# Altium schematic symbol library WR-TBL_Pluggable PCB Header.SchLib: 719 symbols (part 4 of 5) (continued)
## 691382010012
designator P?
WR-TBL Serie 382 Horizontal PCB Header, Pluggable, pitch 2.5mm, 12p; Part Number: 691382010012; Compliance: RoHS; Modularity: No; Pin Number: 12; Rated Current [UL]: 12A; Working Voltage [UL]: 300VAC; ComponentLink1Description: Manufacturer; ComponentLink1URL: http://www.we-online.de; ComponentLink2URL: https://katalog.we-online.de/em/datasheet/691382010012.pdf; ComponentLink2Description: Datasheet; Mounting Technology: THT; Packaging: Box; Operating Temperature: -40 to +105degC; PCB/Cable/Panel: PCB; Pitch: 2.5mm; Published Date: October 2019; Type: Horizontal; Publisher: Wurth Elektronik; Application: Pluggable
footprint 691382010012
pins: 1, 2, 3, 4, 5, 6, 7, 8, 9, 10, 11, 12

## 691382030002
designator P?
WR-TBL Serie 382 Vertical PCB Header with Flanges, Pluggable, pitch 2.5mm, 2p; Part Number: 691382030002; Compliance: RoHS; Modularity: No; Pin Number: 2; Rated Current [UL]: 12A; Working Voltage [UL]: 300VAC; ComponentLink1Description: Manufacturer; ComponentLink1URL: http://www.we-online.de; ComponentLink2URL: https://katalog.we-online.de/em/datasheet/691382030002.pdf; ComponentLink2Description: Datasheet; Mounting Technology: THT; Packaging: Box; Operating Temperature: -40 to +105degC; PCB/Cable/Panel: PCB; Pitch: 2.5mm; Published Date: October 2019; Type: Vertical; Publisher: Wurth Elektronik; Application: Pluggable
footprint 691382030002
pins: 1, 2

## 691382030003
designator P?
WR-TBL Serie 382 Vertical PCB Header with Flanges, Pluggable, pitch 2.5mm, 3p; Part Number: 691382030003; Compliance: RoHS; Modularity: No; Pin Number: 3; Rated Current [UL]: 12A; Working Voltage [UL]: 300VAC; ComponentLink1Description: Manufacturer; ComponentLink1URL: http://www.we-online.de; ComponentLink2URL: https://katalog.we-online.de/em/datasheet/691382030003.pdf; ComponentLink2Description: Datasheet; Mounting Technology: THT; Packaging: Box; Operating Temperature: -40 to +105degC; PCB/Cable/Panel: PCB; Pitch: 2.5mm; Published Date: October 2019; Type: Vertical; Publisher: Wurth Elektronik; Application: Pluggable
footprint 691382030003
pins: 1, 2, 3

## 691382030004
designator P?
WR-TBL Serie 382 Vertical PCB Header with Flanges, Pluggable, pitch 2.5mm, 4p; Part Number: 691382030004; Compliance: RoHS; Modularity: No; Pin Number: 4; Rated Current [UL]: 12A; Working Voltage [UL]: 300VAC; ComponentLink1Description: Manufacturer; ComponentLink1URL: http://www.we-online.de; ComponentLink2URL: https://katalog.we-online.de/em/datasheet/691382030004.pdf; ComponentLink2Description: Datasheet; Mounting Technology: THT; Packaging: Box; Operating Temperature: -40 to +105degC; PCB/Cable/Panel: PCB; Pitch: 2.5mm; Published Date: October 2019; Type: Vertical; Publisher: Wurth Elektronik; Application: Pluggable
footprint 691382030004
pins: 1, 2, 3, 4

## 691382030005
designator P?
WR-TBL Serie 382 Vertical PCB Header with Flanges, Pluggable, pitch 2.5mm, 5p; Part Number: 691382030005; Compliance: RoHS; Modularity: No; Pin Number: 5; Rated Current [UL]: 12A; Working Voltage [UL]: 300VAC; ComponentLink1Description: Manufacturer; ComponentLink1URL: http://www.we-online.de; ComponentLink2URL: https://katalog.we-online.de/em/datasheet/691382030005.pdf; ComponentLink2Description: Datasheet; Mounting Technology: THT; Packaging: Box; Operating Temperature: -40 to +105degC; PCB/Cable/Panel: PCB; Pitch: 2.5mm; Published Date: October 2019; Type: Vertical; Publisher: Wurth Elektronik; Application: Pluggable
footprint 691382030005
pins: 1, 2, 3, 4, 5

## 691382030006
designator P?
WR-TBL Serie 382 Vertical PCB Header with Flanges, Pluggable, pitch 2.5mm, 6p; Part Number: 691382030006; Compliance: RoHS; Modularity: No; Pin Number: 6; Rated Current [UL]: 12A; Working Voltage [UL]: 300VAC; ComponentLink1Description: Manufacturer; ComponentLink1URL: http://www.we-online.de; ComponentLink2URL: https://katalog.we-online.de/em/datasheet/691382030006.pdf; ComponentLink2Description: Datasheet; Mounting Technology: THT; Packaging: Box; Operating Temperature: -40 to +105degC; PCB/Cable/Panel: PCB; Pitch: 2.5mm; Published Date: October 2019; Type: Vertical; Publisher: Wurth Elektronik; Application: Pluggable
footprint 691382030006
pins: 1, 2, 3, 4, 5, 6

## 691382030007
designator P?
WR-TBL Serie 382 Vertical PCB Header with Flanges, Pluggable, pitch 2.5mm, 7p; Part Number: 691382030007; Compliance: RoHS; Modularity: No; Pin Number: 7; Rated Current [UL]: 12A; Working Voltage [UL]: 300VAC; ComponentLink1Description: Manufacturer; ComponentLink1URL: http://www.we-online.de; ComponentLink2URL: https://katalog.we-online.de/em/datasheet/691382030007.pdf; ComponentLink2Description: Datasheet; Mounting Technology: THT; Packaging: Box; Operating Temperature: -40 to +105degC; PCB/Cable/Panel: PCB; Pitch: 2.5mm; Published Date: October 2019; Type: Vertical; Publisher: Wurth Elektronik; Application: Pluggable
footprint 691382030007
pins: 1, 2, 3, 4, 5, 6, 7

## 691382030008
designator P?
WR-TBL Serie 382 Vertical PCB Header with Flanges, Pluggable, pitch 2.5mm, 8p; Part Number: 691382030008; Compliance: RoHS; Modularity: No; Pin Number: 8; Rated Current [UL]: 12A; Working Voltage [UL]: 300VAC; ComponentLink1Description: Manufacturer; ComponentLink1URL: http://www.we-online.de; ComponentLink2URL: https://katalog.we-online.de/em/datasheet/691382030008.pdf; ComponentLink2Description: Datasheet; Mounting Technology: THT; Packaging: Box; Operating Temperature: -40 to +105degC; PCB/Cable/Panel: PCB; Pitch: 2.5mm; Published Date: October 2019; Type: Vertical; Publisher: Wurth Elektronik; Application: Pluggable
footprint 691382030008
pins: 1, 2, 3, 4, 5, 6, 7, 8

## 691382030012
designator P?
WR-TBL Serie 382 Vertical PCB Header with Flanges, Pluggable, pitch 2.5mm, 12p; Part Number: 691382030012; Compliance: RoHS; Modularity: No; Pin Number: 12; Rated Current [UL]: 12A; Working Voltage [UL]: 300VAC; ComponentLink1Description: Manufacturer; ComponentLink1URL: http://www.we-online.de; ComponentLink2URL: https://katalog.we-online.de/em/datasheet/691382030012.pdf; ComponentLink2Description: Datasheet; Mounting Technology: THT; Packaging: Box; Operating Temperature: -40 to +105degC; PCB/Cable/Panel: PCB; Pitch: 2.5mm; Published Date: October 2019; Type: Vertical; Publisher: Wurth Elektronik; Application: Pluggable
footprint 691382030012
pins: 1, 2, 3, 4, 5, 6, 7, 8, 9, 10, 11, 12

## 691382040002
designator P?
WR-TBL Serie 382 Horizontal PCB Header with Flanges, Pluggable, pitch 2.5mm, 2p; Part Number: 691382040002; Compliance: RoHS; Modularity: No; Pin Number: 2; Rated Current [UL]: 12A; Working Voltage [UL]: 300VAC; ComponentLink1Description: Manufacturer; ComponentLink1URL: http://www.we-online.de; ComponentLink2URL: https://katalog.we-online.de/em/datasheet/691382040002.pdf; ComponentLink2Description: Datasheet; Mounting Technology: THT; Packaging: Box; Operating Temperature: -40 to +105degC; PCB/Cable/Panel: PCB; Pitch: 2.5mm; Published Date: October 2019; Type: Horizontal; Publisher: Wurth Elektronik; Application: Pluggable
footprint 691382040002
pins: 1, 2

## 691382040003
designator P?
WR-TBL Serie 382 Horizontal PCB Header with Flanges, Pluggable, pitch 2.5mm, 3p; Part Number: 691382040003; Compliance: RoHS; Modularity: No; Pin Number: 3; Rated Current [UL]: 12A; Working Voltage [UL]: 300VAC; ComponentLink1Description: Manufacturer; ComponentLink1URL: http://www.we-online.de; ComponentLink2URL: https://katalog.we-online.de/em/datasheet/691382040003.pdf; ComponentLink2Description: Datasheet; Mounting Technology: THT; Packaging: Box; Operating Temperature: -40 to +105degC; PCB/Cable/Panel: PCB; Pitch: 2.5mm; Published Date: October 2019; Type: Horizontal; Publisher: Wurth Elektronik; Application: Pluggable
footprint 691382040003
pins: 1, 2, 3

## 691382040004
designator P?
WR-TBL Serie 382 Horizontal PCB Header with Flanges, Pluggable, pitch 2.5mm, 4p; Part Number: 691382040004; Compliance: RoHS; Modularity: No; Pin Number: 4; Rated Current [UL]: 12A; Working Voltage [UL]: 300VAC; ComponentLink1Description: Manufacturer; ComponentLink1URL: http://www.we-online.de; ComponentLink2URL: https://katalog.we-online.de/em/datasheet/691382040004.pdf; ComponentLink2Description: Datasheet; Mounting Technology: THT; Packaging: Box; Operating Temperature: -40 to +105degC; PCB/Cable/Panel: PCB; Pitch: 2.5mm; Published Date: October 2019; Type: Horizontal; Publisher: Wurth Elektronik; Application: Pluggable
footprint 691382040004
pins: 1, 2, 3, 4

## 691382040005
designator P?
WR-TBL Serie 382 Horizontal PCB Header with Flanges, Pluggable, pitch 2.5mm, 5p; Part Number: 691382040005; Compliance: RoHS; Modularity: No; Pin Number: 5; Rated Current [UL]: 12A; Working Voltage [UL]: 300VAC; ComponentLink1Description: Manufacturer; ComponentLink1URL: http://www.we-online.de; ComponentLink2URL: https://katalog.we-online.de/em/datasheet/691382040005.pdf; ComponentLink2Description: Datasheet; Mounting Technology: THT; Packaging: Box; Operating Temperature: -40 to +105degC; PCB/Cable/Panel: PCB; Pitch: 2.5mm; Published Date: October 2019; Type: Horizontal; Publisher: Wurth Elektronik; Application: Pluggable
footprint 691382040005
pins: 1, 2, 3, 4, 5

## 691382040006
designator P?
WR-TBL Serie 382 Horizontal PCB Header with Flanges, Pluggable, pitch 2.5mm, 6p; Part Number: 691382040006; Compliance: RoHS; Modularity: No; Pin Number: 6; Rated Current [UL]: 12A; Working Voltage [UL]: 300VAC; ComponentLink1Description: Manufacturer; ComponentLink1URL: http://www.we-online.de; ComponentLink2URL: https://katalog.we-online.de/em/datasheet/691382040006.pdf; ComponentLink2Description: Datasheet; Mounting Technology: THT; Packaging: Box; Operating Temperature: -40 to +105degC; PCB/Cable/Panel: PCB; Pitch: 2.5mm; Published Date: October 2019; Type: Horizontal; Publisher: Wurth Elektronik; Application: Pluggable
footprint 691382040006
pins: 1, 2, 3, 4, 5, 6

## 691382040007
designator P?
WR-TBL Serie 382 Horizontal PCB Header with Flanges, Pluggable, pitch 2.5mm, 7p; Part Number: 691382040007; Compliance: RoHS; Modularity: No; Pin Number: 7; Rated Current [UL]: 12A; Working Voltage [UL]: 300VAC; ComponentLink1Description: Manufacturer; ComponentLink1URL: http://www.we-online.de; ComponentLink2URL: https://katalog.we-online.de/em/datasheet/691382040007.pdf; ComponentLink2Description: Datasheet; Mounting Technology: THT; Packaging: Box; Operating Temperature: -40 to +105degC; PCB/Cable/Panel: PCB; Pitch: 2.5mm; Published Date: October 2019; Type: Horizontal; Publisher: Wurth Elektronik; Application: Pluggable
footprint 691382040007
pins: 1, 2, 3, 4, 5, 6, 7

## 691382040008
designator P?
WR-TBL Serie 382 Horizontal PCB Header with Flanges, Pluggable, pitch 2.5mm, 8p; Part Number: 691382040008; Compliance: RoHS; Modularity: No; Pin Number: 8; Rated Current [UL]: 12A; Working Voltage [UL]: 300VAC; ComponentLink1Description: Manufacturer; ComponentLink1URL: http://www.we-online.de; ComponentLink2URL: https://katalog.we-online.de/em/datasheet/691382040008.pdf; ComponentLink2Description: Datasheet; Mounting Technology: THT; Packaging: Box; Operating Temperature: -40 to +105degC; PCB/Cable/Panel: PCB; Pitch: 2.5mm; Published Date: October 2019; Type: Horizontal; Publisher: Wurth Elektronik; Application: Pluggable
footprint 691382040008
pins: 1, 2, 3, 4, 5, 6, 7, 8

## 691382040012
designator P?
WR-TBL Serie 382 Horizontal PCB Header with Flanges, Pluggable, pitch 2.5mm, 12p; Part Number: 691382040012; Compliance: RoHS; Modularity: No; Pin Number: 12; Rated Current [UL]: 12A; Working Voltage [UL]: 300VAC; ComponentLink1Description: Manufacturer; ComponentLink1URL: http://www.we-online.de; ComponentLink2URL: https://katalog.we-online.de/em/datasheet/691382040012.pdf; ComponentLink2Description: Datasheet; Mounting Technology: THT; Packaging: Box; Operating Temperature: -40 to +105degC; PCB/Cable/Panel: PCB; Pitch: 2.5mm; Published Date: October 2019; Type: Horizontal; Publisher: Wurth Elektronik; Application: Pluggable
footprint 691382040012
pins: 1, 2, 3, 4, 5, 6, 7, 8, 9, 10, 11, 12

## 691386700002
designator P?
WR-TBL Serie 386 Horizontal/Vertical Divisible PCB Header, Pluggable, pitch 5mm, 2p; Part Number: 691386700002; Compliance: RoHS; Modularity: No; Pin Number: 2; Rated Current [UL]: 14A; Working Voltage [UL]: 300VAC; ComponentLink1Description: Manufacturer; ComponentLink1URL: http://www.we-online.de; ComponentLink2URL: https://katalog.we-online.de/em/datasheet/691386700002.pdf; ComponentLink2Description: Datasheet; Mounting Technology: THT; Packaging: Box; Operating Temperature: -30 to +120degC; PCB/Cable/Panel: PCB; Pitch: 5mm; Published Date: October 2019; Type: Horizontal/Vertical; Publisher: Wurth Elektronik; Application: Pluggable
footprint 691386700002
pins: 1, 2

## 691386700003
designator P?
WR-TBL Serie 386 Horizontal/Vertical Divisible PCB Header, Pluggable, pitch 5mm, 3p; Part Number: 691386700003; Compliance: RoHS; Modularity: No; Pin Number: 3; Rated Current [UL]: 14A; Working Voltage [UL]: 300VAC; ComponentLink1Description: Manufacturer; ComponentLink1URL: http://www.we-online.de; ComponentLink2URL: https://katalog.we-online.de/em/datasheet/691386700003.pdf; ComponentLink2Description: Datasheet; Mounting Technology: THT; Packaging: Box; Operating Temperature: -30 to +120degC; PCB/Cable/Panel: PCB; Pitch: 5mm; Published Date: October 2019; Type: Horizontal/Vertical; Publisher: Wurth Elektronik; Application: Pluggable
footprint 691386700003
pins: 1, 2, 3

## 691386700004
designator P?
WR-TBL Serie 386 Horizontal/Vertical Divisible PCB Header, Pluggable, pitch 5mm, 4p; Part Number: 691386700004; Compliance: RoHS; Modularity: No; Pin Number: 4; Rated Current [UL]: 14A; Working Voltage [UL]: 300VAC; ComponentLink1Description: Manufacturer; ComponentLink1URL: http://www.we-online.de; ComponentLink2URL: https://katalog.we-online.de/em/datasheet/691386700004.pdf; ComponentLink2Description: Datasheet; Mounting Technology: THT; Packaging: Box; Operating Temperature: -30 to +120degC; PCB/Cable/Panel: PCB; Pitch: 5mm; Published Date: October 2019; Type: Horizontal/Vertical; Publisher: Wurth Elektronik; Application: Pluggable
footprint 691386700004
pins: 1, 2, 3, 4

## 691386700005
designator P?
WR-TBL Serie 386 Horizontal/Vertical Divisible PCB Header, Pluggable, pitch 5mm, 5p; Part Number: 691386700005; Compliance: RoHS; Modularity: No; Pin Number: 5; Rated Current [UL]: 14A; Working Voltage [UL]: 300VAC; ComponentLink1Description: Manufacturer; ComponentLink1URL: http://www.we-online.de; ComponentLink2URL: https://katalog.we-online.de/em/datasheet/691386700005.pdf; ComponentLink2Description: Datasheet; Mounting Technology: THT; Packaging: Box; Operating Temperature: -30 to +120degC; PCB/Cable/Panel: PCB; Pitch: 5mm; Published Date: October 2019; Type: Horizontal/Vertical; Publisher: Wurth Elektronik; Application: Pluggable
footprint 691386700005
pins: 1, 2, 3, 4, 5

## 691386700006
designator P?
WR-TBL Serie 386 Horizontal/Vertical Divisible PCB Header, Pluggable, pitch 5mm, 6p; Part Number: 691386700006; Compliance: RoHS; Modularity: No; Pin Number: 6; Rated Current [UL]: 14A; Working Voltage [UL]: 300VAC; ComponentLink1Description: Manufacturer; ComponentLink1URL: http://www.we-online.de; ComponentLink2URL: https://katalog.we-online.de/em/datasheet/691386700006.pdf; ComponentLink2Description: Datasheet; Mounting Technology: THT; Packaging: Box; Operating Temperature: -30 to +120degC; PCB/Cable/Panel: PCB; Pitch: 5mm; Published Date: October 2019; Type: Horizontal/Vertical; Publisher: Wurth Elektronik; Application: Pluggable
footprint 691386700006
pins: 1, 2, 3, 4, 5, 6

## 691386700007
designator P?
WR-TBL Serie 386 Horizontal/Vertical Divisible PCB Header, Pluggable, pitch 5mm, 7p; Part Number: 691386700007; Compliance: RoHS; Modularity: No; Pin Number: 7; Rated Current [UL]: 14A; Working Voltage [UL]: 300VAC; ComponentLink1Description: Manufacturer; ComponentLink1URL: http://www.we-online.de; ComponentLink2URL: https://katalog.we-online.de/em/datasheet/691386700007.pdf; ComponentLink2Description: Datasheet; Mounting Technology: THT; Packaging: Box; Operating Temperature: -30 to +120degC; PCB/Cable/Panel: PCB; Pitch: 5mm; Published Date: October 2019; Type: Horizontal/Vertical; Publisher: Wurth Elektronik; Application: Pluggable
footprint 691386700007
pins: 1, 2, 3, 4, 5, 6, 7

## 691386700008
designator P?
WR-TBL Serie 386 Horizontal/Vertical Divisible PCB Header, Pluggable, pitch 5mm, 8p; Part Number: 691386700008; Compliance: RoHS; Modularity: No; Pin Number: 8; Rated Current [UL]: 14A; Working Voltage [UL]: 300VAC; ComponentLink1Description: Manufacturer; ComponentLink1URL: http://www.we-online.de; ComponentLink2URL: https://katalog.we-online.de/em/datasheet/691386700008.pdf; ComponentLink2Description: Datasheet; Mounting Technology: THT; Packaging: Box; Operating Temperature: -30 to +120degC; PCB/Cable/Panel: PCB; Pitch: 5mm; Published Date: October 2019; Type: Horizontal/Vertical; Publisher: Wurth Elektronik; Application: Pluggable
footprint 691386700008
pins: 1, 2, 3, 4, 5, 6, 7, 8

## 691386700009
designator P?
WR-TBL Serie 386 Horizontal/Vertical Divisible PCB Header, Pluggable, pitch 5mm, 9p; Part Number: 691386700009; Compliance: RoHS; Modularity: No; Pin Number: 9; Rated Current [UL]: 14A; Working Voltage [UL]: 300VAC; ComponentLink1Description: Manufacturer; ComponentLink1URL: http://www.we-online.de; ComponentLink2URL: https://katalog.we-online.de/em/datasheet/691386700009.pdf; ComponentLink2Description: Datasheet; Mounting Technology: THT; Packaging: Box; Operating Temperature: -30 to +120degC; PCB/Cable/Panel: PCB; Pitch: 5mm; Published Date: October 2019; Type: Horizontal/Vertical; Publisher: Wurth Elektronik; Application: Pluggable
footprint 691386700009
pins: 1, 2, 3, 4, 5, 6, 7, 8, 9

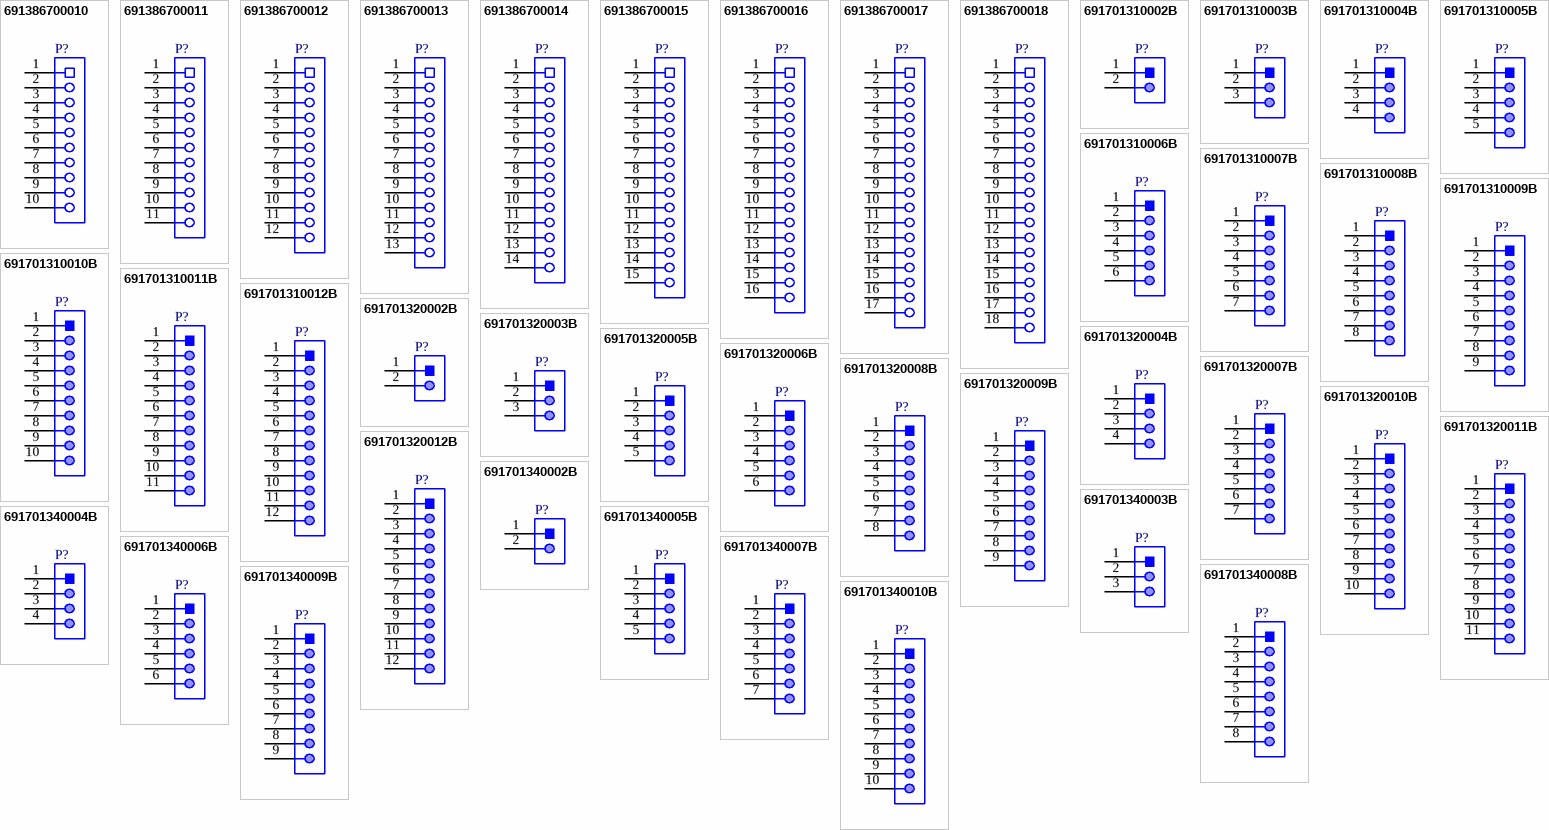
[diagram p15: symbols 691386700010 to 691701340010B]

## 691386700010
designator P?
WR-TBL Serie 386 Horizontal/Vertical Divisible PCB Header, Pluggable, pitch 5mm, 10p; Part Number: 691386700010; Compliance: RoHS; Modularity: No; Pin Number: 10; Rated Current [UL]: 14A; Working Voltage [UL]: 300VAC; ComponentLink1Description: Manufacturer; ComponentLink1URL: http://www.we-online.de; ComponentLink2URL: https://katalog.we-online.de/em/datasheet/691386700010.pdf; ComponentLink2Description: Datasheet; Mounting Technology: THT; Packaging: Box; Operating Temperature: -30 to +120degC; PCB/Cable/Panel: PCB; Pitch: 5mm; Published Date: October 2019; Type: Horizontal/Vertical; Publisher: Wurth Elektronik; Application: Pluggable
footprint 691386700010
pins: 1, 2, 3, 4, 5, 6, 7, 8, 9, 10

## 691386700011
designator P?
WR-TBL Serie 386 Horizontal/Vertical Divisible PCB Header, Pluggable, pitch 5mm, 11p; Part Number: 691386700011; Compliance: RoHS; Modularity: No; Pin Number: 11; Rated Current [UL]: 14A; Working Voltage [UL]: 300VAC; ComponentLink1Description: Manufacturer; ComponentLink1URL: http://www.we-online.de; ComponentLink2URL: https://katalog.we-online.de/em/datasheet/691386700011.pdf; ComponentLink2Description: Datasheet; Mounting Technology: THT; Packaging: Box; Operating Temperature: -30 to +120degC; PCB/Cable/Panel: PCB; Pitch: 5mm; Published Date: October 2019; Type: Horizontal/Vertical; Publisher: Wurth Elektronik; Application: Pluggable
footprint 691386700011
pins: 1, 2, 3, 4, 5, 6, 7, 8, 9, 10, 11

## 691386700012
designator P?
WR-TBL Serie 386 Horizontal/Vertical Divisible PCB Header, Pluggable, pitch 5mm, 12p; Part Number: 691386700012; Compliance: RoHS; Modularity: No; Pin Number: 12; Rated Current [UL]: 14A; Working Voltage [UL]: 300VAC; ComponentLink1Description: Manufacturer; ComponentLink1URL: http://www.we-online.de; ComponentLink2URL: https://katalog.we-online.de/em/datasheet/691386700012.pdf; ComponentLink2Description: Datasheet; Mounting Technology: THT; Packaging: Box; Operating Temperature: -30 to +120degC; PCB/Cable/Panel: PCB; Pitch: 5mm; Published Date: October 2019; Type: Horizontal/Vertical; Publisher: Wurth Elektronik; Application: Pluggable
footprint 691386700012
pins: 1, 2, 3, 4, 5, 6, 7, 8, 9, 10, 11, 12

## 691386700013
designator P?
WR-TBL Serie 386 Horizontal/Vertical Divisible PCB Header, Pluggable, pitch 5mm, 13p; Part Number: 691386700013; Compliance: RoHS; Modularity: No; Pin Number: 13; Rated Current [UL]: 14A; Working Voltage [UL]: 300VAC; ComponentLink1Description: Manufacturer; ComponentLink1URL: http://www.we-online.de; ComponentLink2URL: https://katalog.we-online.de/em/datasheet/691386700013.pdf; ComponentLink2Description: Datasheet; Mounting Technology: THT; Packaging: Box; Operating Temperature: -30 to +120degC; PCB/Cable/Panel: PCB; Pitch: 5mm; Published Date: October 2019; Type: Horizontal/Vertical; Publisher: Wurth Elektronik; Application: Pluggable
footprint 691386700013
pins: 1, 2, 3, 4, 5, 6, 7, 8, 9, 10, 11, 12, 13

## 691386700014
designator P?
WR-TBL Serie 386 Horizontal/Vertical Divisible PCB Header, Pluggable, pitch 5mm, 14p; Part Number: 691386700014; Compliance: RoHS; Modularity: No; Pin Number: 14; Rated Current [UL]: 14A; Working Voltage [UL]: 300VAC; ComponentLink1Description: Manufacturer; ComponentLink1URL: http://www.we-online.de; ComponentLink2URL: https://katalog.we-online.de/em/datasheet/691386700014.pdf; ComponentLink2Description: Datasheet; Mounting Technology: THT; Packaging: Box; Operating Temperature: -30 to +120degC; PCB/Cable/Panel: PCB; Pitch: 5mm; Published Date: October 2019; Type: Horizontal/Vertical; Publisher: Wurth Elektronik; Application: Pluggable
footprint 691386700014
pins: 1, 2, 3, 4, 5, 6, 7, 8, 9, 10, 11, 12, 13, 14

## 691386700015
designator P?
WR-TBL Serie 386 Horizontal/Vertical Divisible PCB Header, Pluggable, pitch 5mm, 15p; Part Number: 691386700015; Compliance: RoHS; Modularity: No; Pin Number: 15; Rated Current [UL]: 14A; Working Voltage [UL]: 300VAC; ComponentLink1Description: Manufacturer; ComponentLink1URL: http://www.we-online.de; ComponentLink2URL: https://katalog.we-online.de/em/datasheet/691386700015.pdf; ComponentLink2Description: Datasheet; Mounting Technology: THT; Packaging: Box; Operating Temperature: -30 to +120degC; PCB/Cable/Panel: PCB; Pitch: 5mm; Published Date: October 2019; Type: Horizontal/Vertical; Publisher: Wurth Elektronik; Application: Pluggable
footprint 691386700015
pins: 1, 2, 3, 4, 5, 6, 7, 8, 9, 10, 11, 12, 13, 14, 15

## 691386700016
designator P?
WR-TBL Serie 386 Horizontal/Vertical Divisible PCB Header, Pluggable, pitch 5mm, 16p; Part Number: 691386700016; Compliance: RoHS; Modularity: No; Pin Number: 16; Rated Current [UL]: 14A; Working Voltage [UL]: 300VAC; ComponentLink1Description: Manufacturer; ComponentLink1URL: http://www.we-online.de; ComponentLink2URL: https://katalog.we-online.de/em/datasheet/691386700016.pdf; ComponentLink2Description: Datasheet; Mounting Technology: THT; Packaging: Box; Operating Temperature: -30 to +120degC; PCB/Cable/Panel: PCB; Pitch: 5mm; Published Date: October 2019; Type: Horizontal/Vertical; Publisher: Wurth Elektronik; Application: Pluggable
footprint 691386700016
pins: 1, 2, 3, 4, 5, 6, 7, 8, 9, 10, 11, 12, 13, 14, 15, 16

## 691386700017
designator P?
WR-TBL Serie 386 Horizontal/Vertical Divisible PCB Header, Pluggable, pitch 5mm, 17p; Part Number: 691386700017; Compliance: RoHS; Modularity: No; Pin Number: 17; Rated Current [UL]: 14A; Working Voltage [UL]: 300VAC; ComponentLink1Description: Manufacturer; ComponentLink1URL: http://www.we-online.de; ComponentLink2URL: https://katalog.we-online.de/em/datasheet/691386700017.pdf; ComponentLink2Description: Datasheet; Mounting Technology: THT; Packaging: Box; Operating Temperature: -30 to +120degC; PCB/Cable/Panel: PCB; Pitch: 5mm; Published Date: October 2019; Type: Horizontal/Vertical; Publisher: Wurth Elektronik; Application: Pluggable
footprint 691386700017
pins: 1, 2, 3, 4, 5, 6, 7, 8, 9, 10, 11, 12, 13, 14, 15, 16, 17

## 691386700018
designator P?
WR-TBL Serie 386 Horizontal/Vertical Divisible PCB Header, Pluggable, pitch 5mm, 18p; Part Number: 691386700018; Compliance: RoHS; Modularity: No; Pin Number: 18; Rated Current [UL]: 14A; Working Voltage [UL]: 300VAC; ComponentLink1Description: Manufacturer; ComponentLink1URL: http://www.we-online.de; ComponentLink2URL: https://katalog.we-online.de/em/datasheet/691386700018.pdf; ComponentLink2Description: Datasheet; Mounting Technology: THT; Packaging: Box; Operating Temperature: -30 to +120degC; PCB/Cable/Panel: PCB; Pitch: 5mm; Published Date: October 2019; Type: Horizontal/Vertical; Publisher: Wurth Elektronik; Application: Pluggable
footprint 691386700018
pins: 1, 2, 3, 4, 5, 6, 7, 8, 9, 10, 11, 12, 13, 14, 15, 16, 17, 18

## 691701310002B
designator P?
WR-TBL Serie 7013B Vertical PCB Header THR Type, Pluggable, pitch 3.81mm, 2p; Part Number: 691701310002B; Compliance: RoHS; Modularity: No; Pin Number: 2; Rated Current [UL]: 10A; Working Voltage [UL]: 300VAC; ComponentLink1Description: Manufacturer; ComponentLink1URL: http://www.we-online.de; ComponentLink2URL: https://katalog.we-online.de/em/datasheet/691701310002B.pdf; ComponentLink2Description: Datasheet; Mounting Technology: THR; Packaging: Box; Operating Temperature: -40 to +105degC; PCB/Cable/Panel: PCB; Pitch: 3.81mm; Published Date: October 2019; Type: Vertical; Publisher: Wurth Elektronik; Application: Pluggable
footprint 691701310002B
pins: 1, 2

## 691701310003B
designator P?
WR-TBL Serie 7013B Vertical PCB Header THR Type, Pluggable, pitch 3.81mm, 3p; Part Number: 691701310003B; Compliance: RoHS; Modularity: No; Pin Number: 3; Rated Current [UL]: 10A; Working Voltage [UL]: 300VAC; ComponentLink1Description: Manufacturer; ComponentLink1URL: http://www.we-online.de; ComponentLink2URL: https://katalog.we-online.de/em/datasheet/691701310003B.pdf; ComponentLink2Description: Datasheet; Mounting Technology: THR; Packaging: Box; Operating Temperature: -40 to +105degC; PCB/Cable/Panel: PCB; Pitch: 3.81mm; Published Date: October 2019; Type: Vertical; Publisher: Wurth Elektronik; Application: Pluggable
footprint 691701310003B
pins: 1, 2, 3

## 691701310004B
designator P?
WR-TBL Serie 7013B Vertical PCB Header THR Type, Pluggable, pitch 3.81mm, 4p; Part Number: 691701310004B; Compliance: RoHS; Modularity: No; Pin Number: 4; Rated Current [UL]: 10A; Working Voltage [UL]: 300VAC; ComponentLink1Description: Manufacturer; ComponentLink1URL: http://www.we-online.de; ComponentLink2URL: https://katalog.we-online.de/em/datasheet/691701310004B.pdf; ComponentLink2Description: Datasheet; Mounting Technology: THR; Packaging: Box; Operating Temperature: -40 to +105degC; PCB/Cable/Panel: PCB; Pitch: 3.81mm; Published Date: October 2019; Type: Vertical; Publisher: Wurth Elektronik; Application: Pluggable
footprint 691701310004B
pins: 1, 2, 3, 4

## 691701310005B
designator P?
WR-TBL Serie 7013B Vertical PCB Header THR Type, Pluggable, pitch 3.81mm, 5p; Part Number: 691701310005B; Compliance: RoHS; Modularity: No; Pin Number: 5; Rated Current [UL]: 10A; Working Voltage [UL]: 300VAC; ComponentLink1Description: Manufacturer; ComponentLink1URL: http://www.we-online.de; ComponentLink2URL: https://katalog.we-online.de/em/datasheet/691701310005B.pdf; ComponentLink2Description: Datasheet; Mounting Technology: THR; Packaging: Box; Operating Temperature: -40 to +105degC; PCB/Cable/Panel: PCB; Pitch: 3.81mm; Published Date: October 2019; Type: Vertical; Publisher: Wurth Elektronik; Application: Pluggable
footprint 691701310005B
pins: 1, 2, 3, 4, 5

## 691701310006B
designator P?
WR-TBL Serie 7013B Vertical PCB Header THR Type, Pluggable, pitch 3.81mm, 6p; Part Number: 691701310006B; Compliance: RoHS; Modularity: No; Pin Number: 6; Rated Current [UL]: 10A; Working Voltage [UL]: 300VAC; ComponentLink1Description: Manufacturer; ComponentLink1URL: http://www.we-online.de; ComponentLink2URL: https://katalog.we-online.de/em/datasheet/691701310006B.pdf; ComponentLink2Description: Datasheet; Mounting Technology: THR; Packaging: Box; Operating Temperature: -40 to +105degC; PCB/Cable/Panel: PCB; Pitch: 3.81mm; Published Date: October 2019; Type: Vertical; Publisher: Wurth Elektronik; Application: Pluggable
footprint 691701310006B
pins: 1, 2, 3, 4, 5, 6

## 691701310007B
designator P?
WR-TBL Serie 7013B Vertical PCB Header THR Type, Pluggable, pitch 3.81mm, 7p; Part Number: 691701310007B; Compliance: RoHS; Modularity: No; Pin Number: 7; Rated Current [UL]: 10A; Working Voltage [UL]: 300VAC; ComponentLink1Description: Manufacturer; ComponentLink1URL: http://www.we-online.de; ComponentLink2URL: https://katalog.we-online.de/em/datasheet/691701310007B.pdf; ComponentLink2Description: Datasheet; Mounting Technology: THR; Packaging: Box; Operating Temperature: -40 to +105degC; PCB/Cable/Panel: PCB; Pitch: 3.81mm; Published Date: October 2019; Type: Vertical; Publisher: Wurth Elektronik; Application: Pluggable
footprint 691701310007B
pins: 1, 2, 3, 4, 5, 6, 7

## 691701310008B
designator P?
WR-TBL Serie 7013B Vertical PCB Header THR Type, Pluggable, pitch 3.81mm, 8p; Part Number: 691701310008B; Compliance: RoHS; Modularity: No; Pin Number: 8; Rated Current [UL]: 10A; Working Voltage [UL]: 300VAC; ComponentLink1Description: Manufacturer; ComponentLink1URL: http://www.we-online.de; ComponentLink2URL: https://katalog.we-online.de/em/datasheet/691701310008B.pdf; ComponentLink2Description: Datasheet; Mounting Technology: THR; Packaging: Box; Operating Temperature: -40 to +105degC; PCB/Cable/Panel: PCB; Pitch: 3.81mm; Published Date: October 2019; Type: Vertical; Publisher: Wurth Elektronik; Application: Pluggable
footprint 691701310008B
pins: 1, 2, 3, 4, 5, 6, 7, 8

## 691701310009B
designator P?
WR-TBL Serie 7013B Vertical PCB Header THR Type, Pluggable, pitch 3.81mm, 9p; Part Number: 691701310009B; Compliance: RoHS; Modularity: No; Pin Number: 9; Rated Current [UL]: 10A; Working Voltage [UL]: 300VAC; ComponentLink1Description: Manufacturer; ComponentLink1URL: http://www.we-online.de; ComponentLink2URL: https://katalog.we-online.de/em/datasheet/691701310009B.pdf; ComponentLink2Description: Datasheet; Mounting Technology: THR; Packaging: Box; Operating Temperature: -40 to +105degC; PCB/Cable/Panel: PCB; Pitch: 3.81mm; Published Date: October 2019; Type: Vertical; Publisher: Wurth Elektronik; Application: Pluggable
footprint 691701310009B
pins: 1, 2, 3, 4, 5, 6, 7, 8, 9

## 691701310010B
designator P?
WR-TBL Serie 7013B Vertical PCB Header THR Type, Pluggable, pitch 3.81mm, 10p; Part Number: 691701310010B; Compliance: RoHS; Modularity: No; Pin Number: 10; Rated Current [UL]: 10A; Working Voltage [UL]: 300VAC; ComponentLink1Description: Manufacturer; ComponentLink1URL: http://www.we-online.de; ComponentLink2URL: https://katalog.we-online.de/em/datasheet/691701310010B.pdf; ComponentLink2Description: Datasheet; Mounting Technology: THR; Packaging: Box; Operating Temperature: -40 to +105degC; PCB/Cable/Panel: PCB; Pitch: 3.81mm; Published Date: October 2019; Type: Vertical; Publisher: Wurth Elektronik; Application: Pluggable
footprint 691701310010B
pins: 1, 2, 3, 4, 5, 6, 7, 8, 9, 10

## 691701310011B
designator P?
WR-TBL Serie 7013B Vertical PCB Header THR Type, Pluggable, pitch 3.81mm, 11p; Part Number: 691701310011B; Compliance: RoHS; Modularity: No; Pin Number: 11; Rated Current [UL]: 10A; Working Voltage [UL]: 300VAC; ComponentLink1Description: Manufacturer; ComponentLink1URL: http://www.we-online.de; ComponentLink2URL: https://katalog.we-online.de/em/datasheet/691701310011B.pdf; ComponentLink2Description: Datasheet; Mounting Technology: THR; Packaging: Box; Operating Temperature: -40 to +105degC; PCB/Cable/Panel: PCB; Pitch: 3.81mm; Published Date: October 2019; Type: Vertical; Publisher: Wurth Elektronik; Application: Pluggable
footprint 691701310011B
pins: 1, 2, 3, 4, 5, 6, 7, 8, 9, 10, 11
